# Altium integrated library Lattice CPLD ispLSI.IntLib: 471 symbols (part 16 of 26) (continued)
## ispLSI3320-100LB320 (continued)
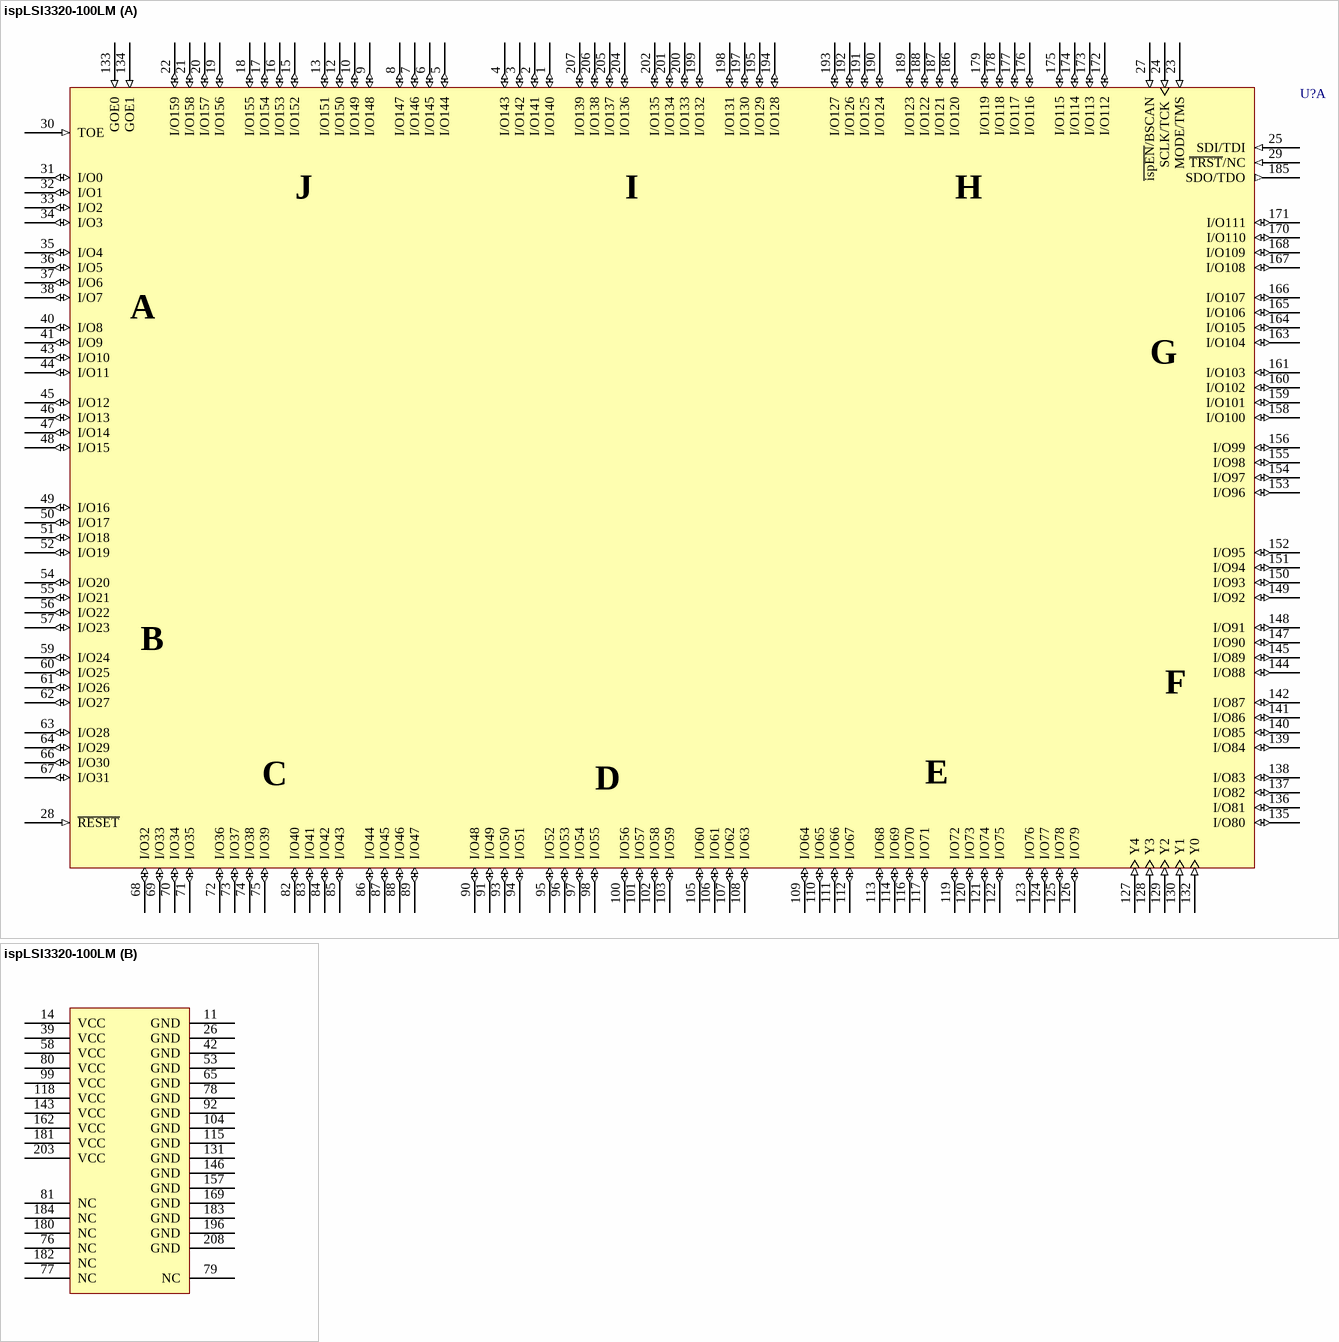
[diagram p153: symbol ispLSI3320-100LM]
part A text: J; I; H; A; G; B; F; C; E; D

## ispLSI3320-100LM
designator U?
In-System Programmable High-Density PLD; Published: 23-Sep-2002; LatestRevisionDate: 13-Apr-2006; LatestRevisionNote: IPC-7351 Footprint Added.; DatasheetVersion: May-1999; PackageVersion: Sep-2000; PackageReference: MQFP208; Publisher: Altium Limited; PackageDescription: 208-Pin Shrink Quad Flat Pack 0.5 mm Pitch; ComponentLink1Description: Manufacturer Link; ComponentLink1URL: http://www.latticesemi.com/products/mature/index.cfm; ComponentLink2Description: Datasheet; ComponentLink2URL: http://www.latticesemi.com/lit/docs/datasheets/cpld/3320.pdf
footprint MQFP208_N (Shrink QFP, 208-Leads, Body 27.7x27.7mm, Pitch 0.5mm, IPC Medium Density)
footprint MQFP208_L (Shrink QFP, 208-Leads, Body 27.7x27.7mm, Pitch 0.5mm, IPC High Density)
footprint MQFP208_M (Shrink QFP, 208-Leads, Body 27.7x27.7mm, Pitch 0.5mm, IPC Low Density)
3D model 3320-MQFP208 (208-Pin Shrink Quad Flat Pack 0.5 mm Pitch)
part A pins: 1 I/O140 (io), 2 I/O141 (io), 3 I/O142 (io), 4 I/O143 (io), 5 I/O144 (io), 6 I/O145 (io), 7 I/O146 (io), 8 I/O147 (io), 9 I/O148 (io), 10 I/O149 (io), 12 I/O150 (io), 13 I/O151 (io), 15 I/O152 (io), 16 I/O153 (io), 17 I/O154 (io), 18 I/O155 (io), 19 I/O156 (io), 20 I/O157 (io), 21 I/O158 (io), 22 I/O159 (io), 23 MODE/TMS (in), 24 SCLK/TCK (in), 25 SDI/TDI (in), 27 ~{ispEN}/BSCAN (in), 28 ~{RESET} (in), 29 ~{TRST}/NC (in), 30 TOE (in), 31 I/O0 (io), 32 I/O1 (io), 33 I/O2 (io), 34 I/O3 (io), 35 I/O4 (io), 36 I/O5 (io), 37 I/O6 (io), 38 I/O7 (io), 40 I/O8 (io), 41 I/O9 (io), 43 I/O10 (io), 44 I/O11 (io), 45 I/O12 (io), 46 I/O13 (io), 47 I/O14 (io), 48 I/O15 (io), 49 I/O16 (io), 50 I/O17 (io), 51 I/O18 (io), 52 I/O19 (io), 54 I/O20 (io), 55 I/O21 (io), 56 I/O22 (io), 57 I/O23 (io), 59 I/O24 (io), 60 I/O25 (io), 61 I/O26 (io), 62 I/O27 (io), 63 I/O28 (io), 64 I/O29 (io), 66 I/O30 (io), 67 I/O31 (io), 68 I/O32 (io), 69 I/O33 (io), 70 I/O34 (io), 71 I/O35 (io), 72 I/O36 (io), 73 I/O37 (io), 74 I/O38 (io), 75 I/O39 (io), 82 I/O40 (io), 83 I/O41 (io), 84 I/O42 (io), 85 I/O43 (io), 86 I/O44 (io), 87 I/O45 (io), 88 I/O46 (io), 89 I/O47 (io), 90 I/O48 (io), 91 I/O49 (io), 93 I/O50 (io), 94 I/O51 (io), 95 I/O52 (io), 96 I/O53 (io), 97 I/O54 (io), 98 I/O55 (io), 100 I/O56 (io), 101 I/O57 (io), 102 I/O58 (io), 103 I/O59 (io), 105 I/O60 (io), 106 I/O61 (io), 107 I/O62 (io), 108 I/O63 (io), 109 I/O64 (io), 110 I/O65 (io), 111 I/O66 (io), 112 I/O67 (io), 113 I/O68 (io), 114 I/O69 (io), 116 I/O70 (io), 117 I/O71 (io), 119 I/O72 (io), 120 I/O73 (io), 121 I/O74 (io), 122 I/O75 (io), 123 I/O76 (io), 124 I/O77 (io), 125 I/O78 (io), 126 I/O79 (io), 127 Y4 (in), 128 Y3 (in), 129 Y2 (in), 130 Y1 (in), 132 Y0 (in), 133 GOE0 (in), 134 GOE1 (in), 135 I/O80 (io), 136 I/O81 (io), 137 I/O82 (io), 138 I/O83 (io), 139 I/O84 (io), 140 I/O85 (io), 141 I/O86 (io), 142 I/O87 (io), 144 I/O88 (io), 145 I/O89 (io), 147 I/O90 (io), 148 I/O91 (io), 149 I/O92 (io), 150 I/O93 (io), 151 I/O94 (io), 152 I/O95 (io), 153 I/O96 (io), 154 I/O97 (io), 155 I/O98 (io), 156 I/O99 (io), 158 I/O100 (io), 159 I/O101 (io), 160 I/O102 (io), 161 I/O103 (io), 163 I/O104 (io), 164 I/O105 (io), 165 I/O106 (io), 166 I/O107 (io), 167 I/O108 (io), 168 I/O109 (io), 170 I/O110 (io), 171 I/O111 (io), 172 I/O112 (io), 173 I/O113 (io), 174 I/O114 (io), 175 I/O115 (io), 176 I/O116 (io), 177 I/O117 (io), 178 I/O118 (io), 179 I/O119 (io), 185 SDO/TDO (out), 186 I/O120 (io), 187 I/O121 (io), 188 I/O122 (io), 189 I/O123 (io), 190 I/O124 (io), 191 I/O125 (io), 192 I/O126 (io), 193 I/O127 (io), 194 I/O128 (io), 195 I/O129 (io), 197 I/O130 (io), 198 I/O131 (io), 199 I/O132 (io), 200 I/O133 (io), 201 I/O134 (io), 202 I/O135 (io), 204 I/O136 (io), 205 I/O137 (io), 206 I/O138 (io), 207 I/O139 (io)
part B pins: 11 GND (power), 14 VCC (power), 26 GND (power), 39 VCC (power), 42 GND (power), 53 GND (power), 58 VCC (power), 65 GND (power), 76 NC, 77 NC, 78 GND (power), 79 NC, 80 VCC (power), 81 NC, 92 GND (power), 99 VCC (power), 104 GND (power), 115 GND (power), 118 VCC (power), 131 GND (power), 143 VCC (power), 146 GND (power), 157 GND (power), 162 VCC (power), 169 GND (power), 180 NC, 181 VCC (power), 182 NC, 183 GND (power), 184 NC, 196 GND (power), 203 VCC (power), 208 GND (power)
part A text: J; I; H; A; G; B; F; C; E; D

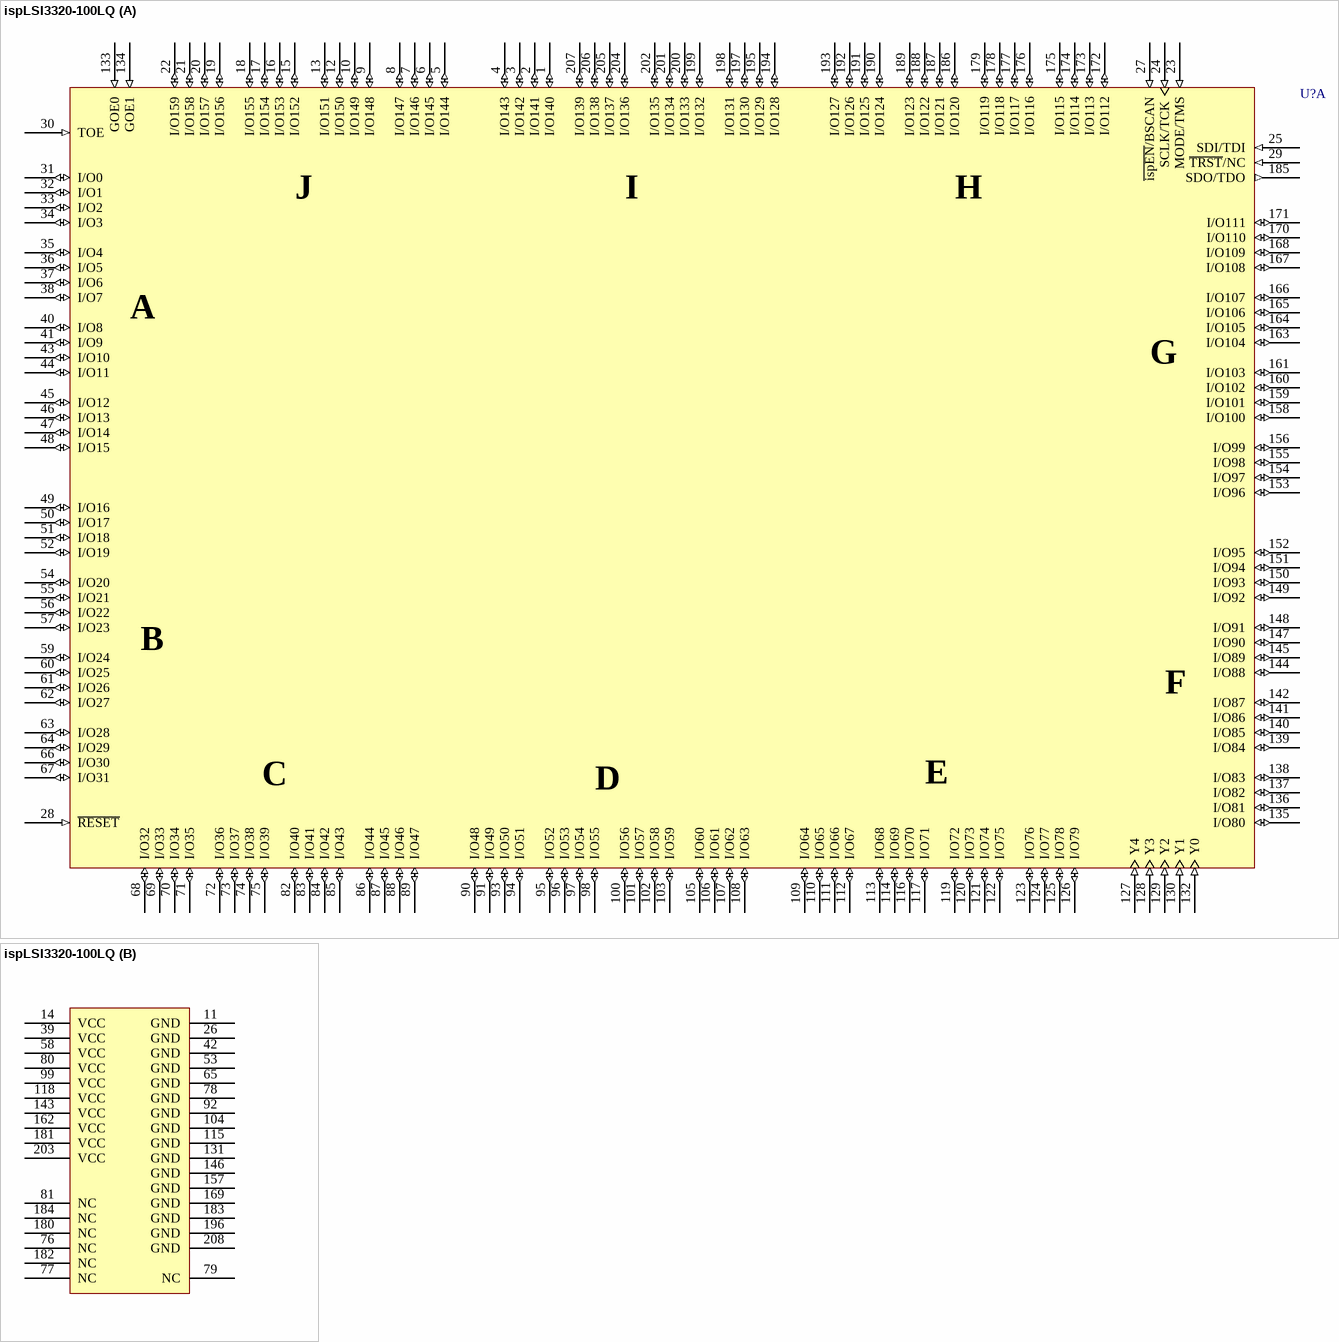
[diagram p154: symbol ispLSI3320-100LQ]

## ispLSI3320-100LQ
designator U?
In-System Programmable High-Density PLD; Published: 23-Sep-2002; LatestRevisionDate: 13-Apr-2006; LatestRevisionNote: IPC-7351 Footprint Added.; DatasheetVersion: May-1999; PackageVersion: pkg_32, Aug-2005; PackageReference: PQFP208; Publisher: Altium Limited; PackageDescription: 208-Pin Plastic Quad Flat Pack (PQFP208); Code_JEDEC: MO-143-FAI; ComponentLink1Description: Manufacturer Link; ComponentLink1URL: http://www.latticesemi.com/products/mature/index.cfm; ComponentLink2Description: Datasheet; ComponentLink2URL: http://www.latticesemi.com/lit/docs/datasheets/cpld/3320.pdf
footprint PQFP208_N (Shrink QFP, 208-Leads, Body 28x28mm, Pitch 0.5mm, IPC Medium Density)
footprint PQFP208_L (Shrink QFP, 208-Leads, Body 28x28mm, Pitch 0.5mm, IPC High Density)
footprint PQFP208_M (Shrink QFP, 208-Leads, Body 28x28mm, Pitch 0.5mm, IPC Low Density)
3D model 3320-PQFP208 (208-Pin Plastic Quad Flat Pack (PQFP208))
part A pins: 1 I/O140 (io), 2 I/O141 (io), 3 I/O142 (io), 4 I/O143 (io), 5 I/O144 (io), 6 I/O145 (io), 7 I/O146 (io), 8 I/O147 (io), 9 I/O148 (io), 10 I/O149 (io), 12 I/O150 (io), 13 I/O151 (io), 15 I/O152 (io), 16 I/O153 (io), 17 I/O154 (io), 18 I/O155 (io), 19 I/O156 (io), 20 I/O157 (io), 21 I/O158 (io), 22 I/O159 (io), 23 MODE/TMS (in), 24 SCLK/TCK (in), 25 SDI/TDI (in), 27 ~{ispEN}/BSCAN (in), 28 ~{RESET} (in), 29 ~{TRST}/NC (in), 30 TOE (in), 31 I/O0 (io), 32 I/O1 (io), 33 I/O2 (io), 34 I/O3 (io), 35 I/O4 (io), 36 I/O5 (io), 37 I/O6 (io), 38 I/O7 (io), 40 I/O8 (io), 41 I/O9 (io), 43 I/O10 (io), 44 I/O11 (io), 45 I/O12 (io), 46 I/O13 (io), 47 I/O14 (io), 48 I/O15 (io), 49 I/O16 (io), 50 I/O17 (io), 51 I/O18 (io), 52 I/O19 (io), 54 I/O20 (io), 55 I/O21 (io), 56 I/O22 (io), 57 I/O23 (io), 59 I/O24 (io), 60 I/O25 (io), 61 I/O26 (io), 62 I/O27 (io), 63 I/O28 (io), 64 I/O29 (io), 66 I/O30 (io), 67 I/O31 (io), 68 I/O32 (io), 69 I/O33 (io), 70 I/O34 (io), 71 I/O35 (io), 72 I/O36 (io), 73 I/O37 (io), 74 I/O38 (io), 75 I/O39 (io), 82 I/O40 (io), 83 I/O41 (io), 84 I/O42 (io), 85 I/O43 (io), 86 I/O44 (io), 87 I/O45 (io), 88 I/O46 (io), 89 I/O47 (io), 90 I/O48 (io), 91 I/O49 (io), 93 I/O50 (io), 94 I/O51 (io), 95 I/O52 (io), 96 I/O53 (io), 97 I/O54 (io), 98 I/O55 (io), 100 I/O56 (io), 101 I/O57 (io), 102 I/O58 (io), 103 I/O59 (io), 105 I/O60 (io), 106 I/O61 (io), 107 I/O62 (io), 108 I/O63 (io), 109 I/O64 (io), 110 I/O65 (io), 111 I/O66 (io), 112 I/O67 (io), 113 I/O68 (io), 114 I/O69 (io), 116 I/O70 (io), 117 I/O71 (io), 119 I/O72 (io), 120 I/O73 (io), 121 I/O74 (io), 122 I/O75 (io), 123 I/O76 (io), 124 I/O77 (io), 125 I/O78 (io), 126 I/O79 (io), 127 Y4 (in), 128 Y3 (in), 129 Y2 (in), 130 Y1 (in), 132 Y0 (in), 133 GOE0 (in), 134 GOE1 (in), 135 I/O80 (io), 136 I/O81 (io), 137 I/O82 (io), 138 I/O83 (io), 139 I/O84 (io), 140 I/O85 (io), 141 I/O86 (io), 142 I/O87 (io), 144 I/O88 (io), 145 I/O89 (io), 147 I/O90 (io), 148 I/O91 (io), 149 I/O92 (io), 150 I/O93 (io), 151 I/O94 (io), 152 I/O95 (io), 153 I/O96 (io), 154 I/O97 (io), 155 I/O98 (io), 156 I/O99 (io), 158 I/O100 (io), 159 I/O101 (io), 160 I/O102 (io), 161 I/O103 (io), 163 I/O104 (io), 164 I/O105 (io), 165 I/O106 (io), 166 I/O107 (io), 167 I/O108 (io), 168 I/O109 (io), 170 I/O110 (io), 171 I/O111 (io), 172 I/O112 (io), 173 I/O113 (io), 174 I/O114 (io), 175 I/O115 (io), 176 I/O116 (io), 177 I/O117 (io), 178 I/O118 (io), 179 I/O119 (io), 185 SDO/TDO (out), 186 I/O120 (io), 187 I/O121 (io), 188 I/O122 (io), 189 I/O123 (io), 190 I/O124 (io), 191 I/O125 (io), 192 I/O126 (io), 193 I/O127 (io), 194 I/O128 (io), 195 I/O129 (io), 197 I/O130 (io), 198 I/O131 (io), 199 I/O132 (io), 200 I/O133 (io), 201 I/O134 (io), 202 I/O135 (io), 204 I/O136 (io), 205 I/O137 (io), 206 I/O138 (io), 207 I/O139 (io)
part B pins: 11 GND (power), 14 VCC (power), 26 GND (power), 39 VCC (power), 42 GND (power), 53 GND (power), 58 VCC (power), 65 GND (power), 76 NC, 77 NC, 78 GND (power), 79 NC, 80 VCC (power), 81 NC, 92 GND (power), 99 VCC (power), 104 GND (power), 115 GND (power), 118 VCC (power), 131 GND (power), 143 VCC (power), 146 GND (power), 157 GND (power), 162 VCC (power), 169 GND (power), 180 NC, 181 VCC (power), 182 NC, 183 GND (power), 184 NC, 196 GND (power), 203 VCC (power), 208 GND (power)
part A text: J; I; H; A; G; B; F; C; E; D

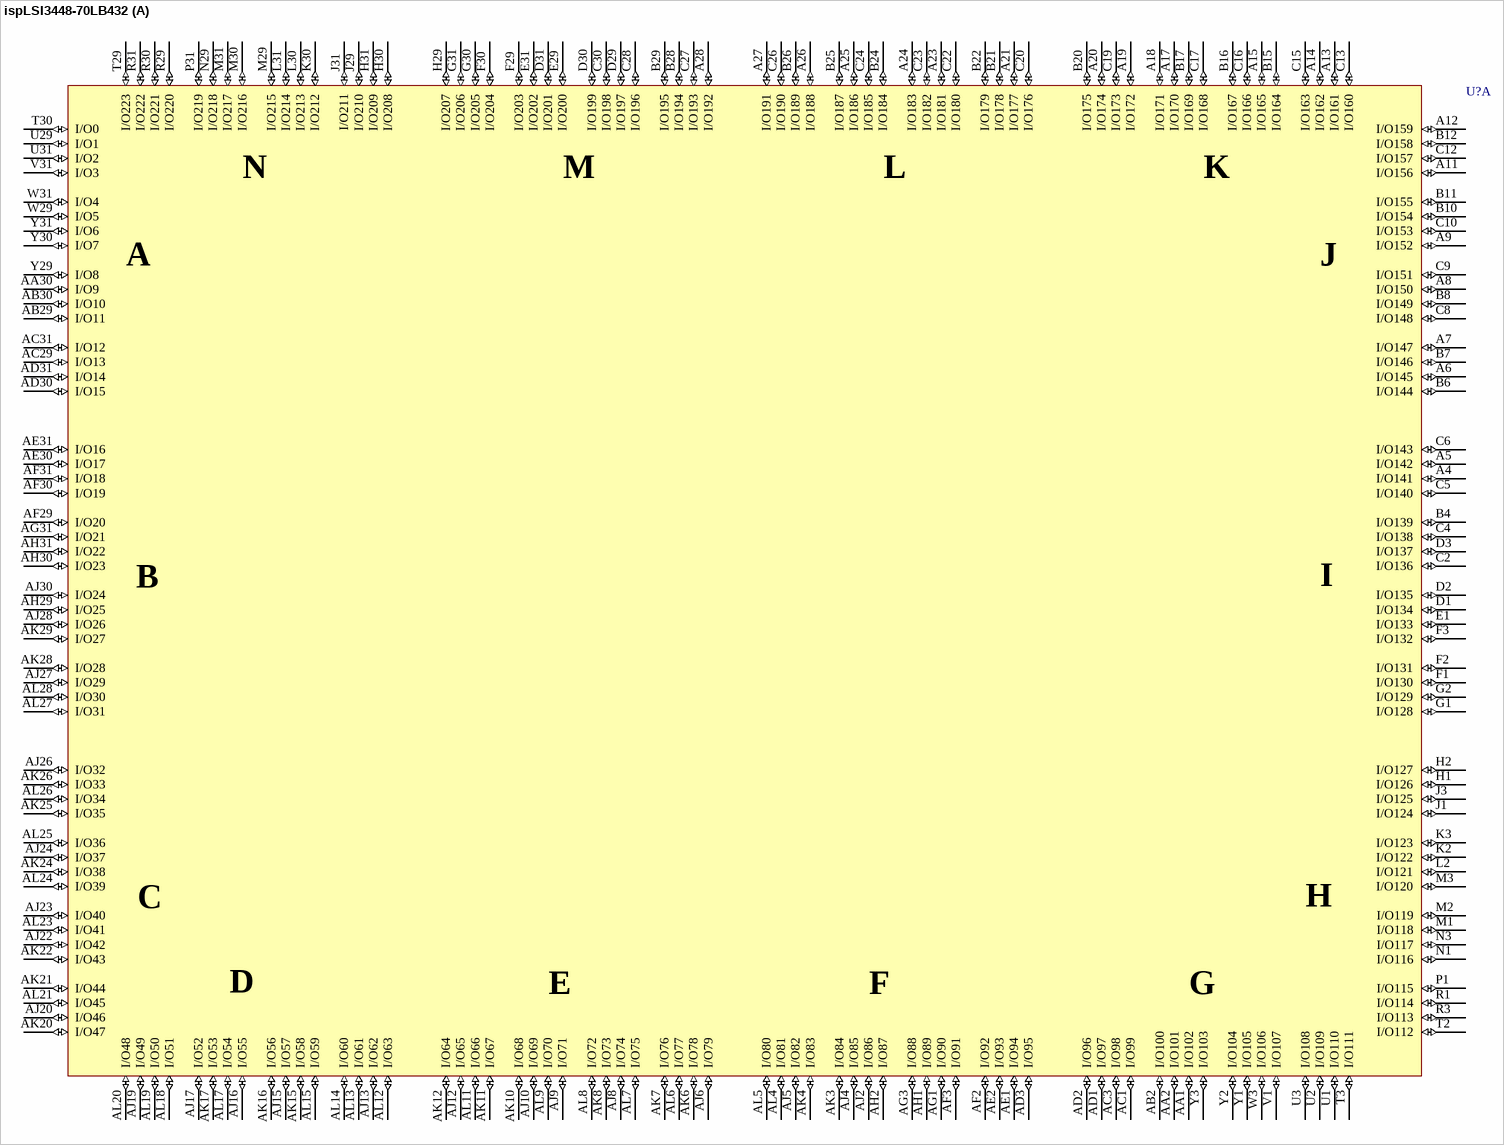
[diagram p155: symbol ispLSI3448-70LB432]

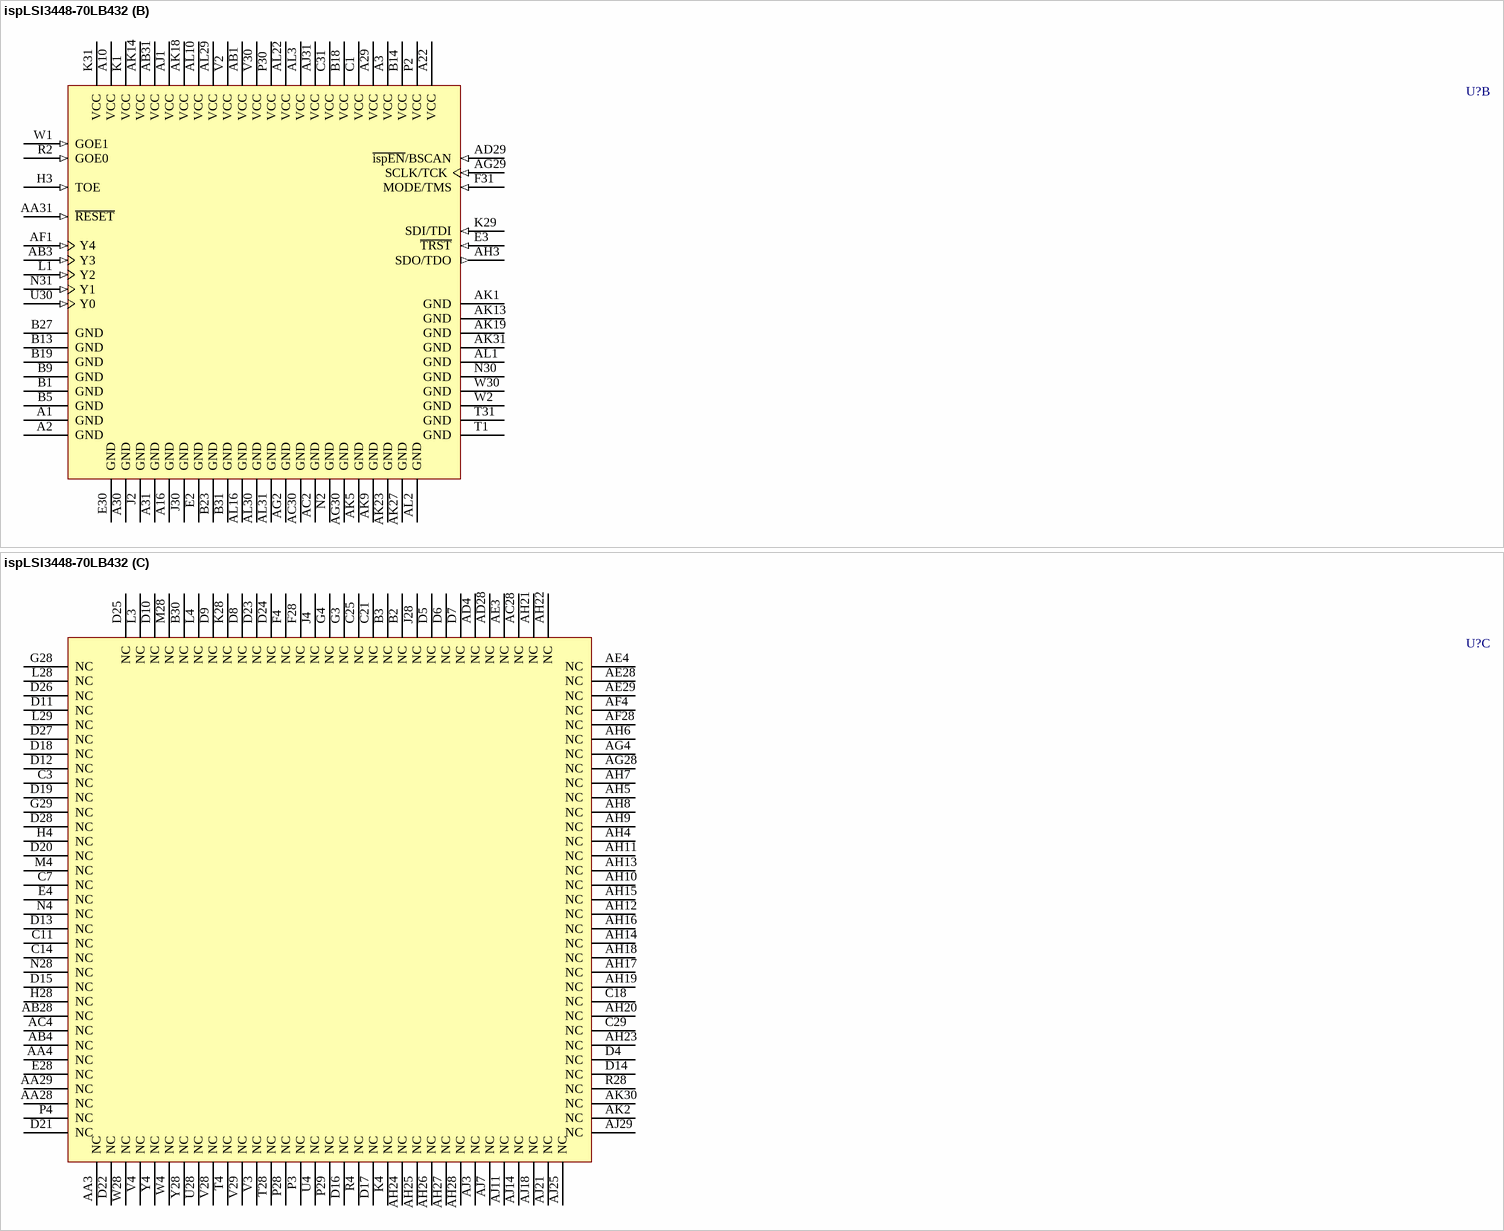
[diagram p156: symbol ispLSI3448-70LB432]

## ispLSI3448-70LB432
designator U?
In-System Programmable High-Density PLD; Published: 23-Sep-2002; LatestRevisionDate: 13-Apr-2006; LatestRevisionNote: IPC-7351 Footprint Added.; DatasheetVersion: Feb-2000; PackageVersion: pkg_32, Aug-2005; PackageReference: SBGA432; Publisher: Altium Limited; PackageDescription: 432-Ball Super Ball Grid Array (SBGA432); ComponentLink1Description: Manufacturer Link; ComponentLink1URL: http://www.latticesemi.com/products/mature/index.cfm; ComponentLink2Description: Datasheet; ComponentLink2URL: http://www.latticesemi.com/lit/docs/datasheets/cpld/3448.pdf
footprint SBGA432 (BGA, 432-Leads, Body 40x40mm, Pitch 1.27mm)
3D model 3448-SBGA432 (432-Ball Super Ball Grid Array (SBGA432))
part A pins: A4 I/O141 (io), A5 I/O142 (io), A6 I/O145 (io), A7 I/O147 (io), A8 I/O150 (io), A9 I/O152 (io), A11 I/O156 (io), A12 I/O159 (io), A13 I/O161 (io), A14 I/O162 (io), A15 I/O165 (io), A17 I/O170 (io), A18 I/O171 (io), A19 I/O172 (io), A20 I/O174 (io), A21 I/O177 (io), A23 I/O181 (io), A24 I/O183 (io), A25 I/O186 (io), A26 I/O188 (io), A27 I/O191 (io), A28 I/O192 (io), AA1 I/O102 (io), AA2 I/O101 (io), AA30 I/O9 (io), AB2 I/O100 (io), AB29 I/O11 (io), AB30 I/O10 (io), AC1 I/O99 (io), AC3 I/O98 (io), AC29 I/O13 (io), AC31 I/O12 (io), AD1 I/O97 (io), AD2 I/O96 (io), AD3 I/O95 (io), AD30 I/O15 (io), AD31 I/O14 (io), AE1 I/O94 (io), AE2 I/O93 (io), AE30 I/O17 (io), AE31 I/O16 (io), AF2 I/O92 (io), AF3 I/O91 (io), AF29 I/O20 (io), AF30 I/O19 (io), AF31 I/O18 (io), AG1 I/O90 (io), AG3 I/O88 (io), AG31 I/O21 (io), AH1 I/O89 (io), AH2 I/O87 (io), AH29 I/O25 (io), AH30 I/O23 (io), AH31 I/O22 (io), AJ2 I/O86 (io), AJ4 I/O85 (io), AJ5 I/O82 (io), AJ6 I/O79 (io), AJ8 I/O74 (io), AJ9 I/O71 (io), AJ10 I/O69 (io), AJ12 I/O65 (io), AJ13 I/O62 (io), AJ15 I/O57 (io), AJ16 I/O55 (io), AJ17 I/O52 (io), AJ19 I/O49 (io), AJ20 I/O46 (io), AJ22 I/O42 (io), AJ23 I/O40 (io), AJ24 I/O37 (io), AJ26 I/O32 (io), AJ27 I/O29 (io), AJ28 I/O26 (io), AJ30 I/O24 (io), AK3 I/O84 (io), AK4 I/O83 (io), AK6 I/O78 (io), AK7 I/O76 (io), AK8 I/O73 (io), AK10 I/O68 (io), AK11 I/O67 (io), AK12 I/O64 (io), AK15 I/O58 (io), AK16 I/O56 (io), AK17 I/O53 (io), AK20 I/O47 (io), AK21 I/O44 (io), AK22 I/O43 (io), AK24 I/O38 (io), AK25 I/O35 (io), AK26 I/O33 (io), AK28 I/O28 (io), AK29 I/O27 (io), AL4 I/O81 (io), AL5 I/O80 (io), AL6 I/O77 (io), AL7 I/O75 (io), AL8 I/O72 (io), AL9 I/O70 (io), AL11 I/O66 (io), AL12 I/O63 (io), AL13 I/O61 (io), AL14 I/O60 (io), AL15 I/O59 (io), AL17 I/O54 (io), AL18 I/O51 (io), AL19 I/O50 (io), AL20 I/O48 (io), AL21 I/O45 (io), AL23 I/O41 (io), AL24 I/O39 (io), AL25 I/O36 (io), AL26 I/O34 (io), AL27 I/O31 (io), AL28 I/O30 (io), B4 I/O139 (io), B6 I/O144 (io), B7 I/O146 (io), B8 I/O149 (io), B10 I/O154 (io), B11 I/O155 (io), B12 I/O158 (io), B15 I/O164 (io), B16 I/O167 (io), B17 I/O169 (io), B20 I/O175 (io), B21 I/O178 (io), B22 I/O179 (io), B24 I/O184 (io), B25 I/O187 (io), B26 I/O189 (io), B28 I/O194 (io), B29 I/O195 (io), C2 I/O136 (io), C4 I/O138 (io), C5 I/O140 (io), C6 I/O143 (io), C8 I/O148 (io), C9 I/O151 (io), C10 I/O153 (io), C12 I/O157 (io), C13 I/O160 (io), C15 I/O163 (io), C16 I/O166 (io), C17 I/O168 (io), C19 I/O173 (io), C20 I/O176 (io), C22 I/O180 (io), C23 I/O182 (io), C24 I/O185 (io), C26 I/O190 (io), C27 I/O193 (io), C28 I/O196 (io), C30 I/O198 (io), D1 I/O134 (io), D2 I/O135 (io), D3 I/O137 (io), D29 I/O197 (io), D30 I/O199 (io), D31 I/O201 (io), E1 I/O133 (io), E29 I/O200 (io), E31 I/O202 (io), F1 I/O130 (io), F2 I/O131 (io), F3 I/O132 (io), F29 I/O203 (io), F30 I/O204 (io), G1 I/O128 (io), G2 I/O129 (io), G30 I/O205 (io), G31 I/O206 (io), H1 I/O126 (io), H2 I/O127 (io), H29 I/O207 (io), H30 I/O208 (io), H31 I/O209 (io), J1 I/O124 (io), J3 I/O125 (io), J29 I/O210 (io), J31 I/O211 (io), K2 I/O122 (io), K3 I/O123 (io), K30 I/O212 (io), L2 I/O121 (io), L30 I/O213 (io), L31 I/O214 (io), M1 I/O118 (io), M2 I/O119 (io), M3 I/O120 (io), M29 I/O215 (io), M30 I/O216 (io), M31 I/O217 (io), N1 I/O116 (io), N3 I/O117 (io), N29 I/O218 (io), P1 I/O115 (io), P31 I/O219 (io), R1 I/O114 (io), R3 I/O113 (io), R29 I/O220 (io), R30 I/O221 (io), R31 I/O222 (io), T2 I/O112 (io), T3 I/O111 (io), T29 I/O223 (io), T30 I/O0 (io), U1 I/O110 (io), U2 I/O109 (io), U3 I/O108 (io), U29 I/O1 (io), U31 I/O2 (io), V1 I/O107 (io), V31 I/O3 (io), W3 I/O106 (io), W29 I/O5 (io), W31 I/O4 (io), Y1 I/O105 (io), Y2 I/O104 (io), Y3 I/O103 (io), Y29 I/O8 (io), Y30 I/O7 (io), Y31 I/O6 (io)
part B pins: A1 GND (power), A2 GND (power), A3 VCC (power), A10 VCC (power), A16 GND (power), A22 VCC (power), A29 VCC (power), A30 GND (power), A31 GND (power), AA31 ~{RESET} (in), AB1 VCC (power), AB3 Y3 (in), AB31 VCC (power), AC2 GND (power), AC30 GND (power), AD29 ~{ispEN}/BSCAN (in), AF1 Y4 (in), AG2 GND (power), AG29 SCLK/TCK (in), AG30 GND (power), AH3 SDO/TDO (out), AJ1 VCC (power), AJ31 VCC (power), AK1 GND (power), AK5 GND (power), AK9 GND (power), AK13 GND (power), AK14 VCC (power), AK18 VCC (power), AK19 GND (power), AK23 GND (power), AK27 GND (power), AK31 GND (power), AL1 GND (power), AL2 GND (power), AL3 VCC (power), AL10 VCC (power), AL16 GND (power), AL22 VCC (power), AL29 VCC (power), AL30 GND (power), AL31 GND (power), B1 GND (power), B5 GND (power), B9 GND (power), B13 GND (power), B14 VCC (power), B18 VCC (power), B19 GND (power), B23 GND (power), B27 GND (power), B31 GND (power), C1 VCC (power), C31 VCC (power), E2 GND (power), E3 ~{TRST} (in), E30 GND (power), F31 MODE/TMS (in), H3 TOE (in), J2 GND (power), J30 GND (power), K1 VCC (power), K29 SDI/TDI (in), K31 VCC (power), L1 Y2 (in), N2 GND (power), N30 GND (power), N31 Y1 (in), P2 VCC (power), P30 VCC (power), R2 GOE0 (in), T1 GND (power), T31 GND (power), U30 Y0 (in), V2 VCC (power), V30 VCC (power), W1 GOE1 (in), W2 GND (power), W30 GND (power)
part C pins: AA3 NC, AA4 NC, AA28 NC, AA29 NC, AB4 NC, AB28 NC, AC4 NC, AC28 NC, AD4 NC, AD28 NC, AE3 NC, AE4 NC, AE28 NC, AE29 NC, AF4 NC, AF28 NC, AG4 NC, AG28 NC, AH4 NC, AH5 NC, AH6 NC, AH7 NC, AH8 NC, AH9 NC, AH10 NC, AH11 NC, AH12 NC, AH13 NC, AH14 NC, AH15 NC, AH16 NC, AH17 NC, AH18 NC, AH19 NC, AH20 NC, AH21 NC, AH22 NC, AH23 NC, AH24 NC, AH25 NC, AH26 NC, AH27 NC, AH28 NC, AJ3 NC, AJ7 NC, AJ11 NC, AJ14 NC, AJ18 NC, AJ21 NC, AJ25 NC, AJ29 NC, AK2 NC, AK30 NC, B2 NC, B3 NC, B30 NC, C3 NC, C7 NC, C11 NC, C14 NC, C18 NC, C21 NC, C25 NC, C29 NC, D4 NC, D5 NC, D6 NC, D7 NC, D8 NC, D9 NC, D10 NC, D11 NC, D12 NC, D13 NC, D14 NC, D15 NC, D16 NC, D17 NC, D18 NC, D19 NC, D20 NC, D21 NC, D22 NC, D23 NC, D24 NC, D25 NC, D26 NC, D27 NC, D28 NC, E4 NC, E28 NC, F4 NC, F28 NC, G3 NC, G4 NC, G28 NC, G29 NC, H4 NC, H28 NC, J4 NC, J28 NC, K4 NC, K28 NC, L3 NC, L4 NC, L28 NC, L29 NC, M4 NC, M28 NC, N4 NC, N28 NC, P3 NC, P4 NC, P28 NC, P29 NC, R4 NC, R28 NC, T4 NC, T28 NC, U4 NC, U28 NC, V3 NC, V4 NC, V28 NC, V29 NC, W4 NC, W28 NC, Y4 NC, Y28 NC
part A text: N; M; L; K; A; J; B; I; C; H; D; E; F; G

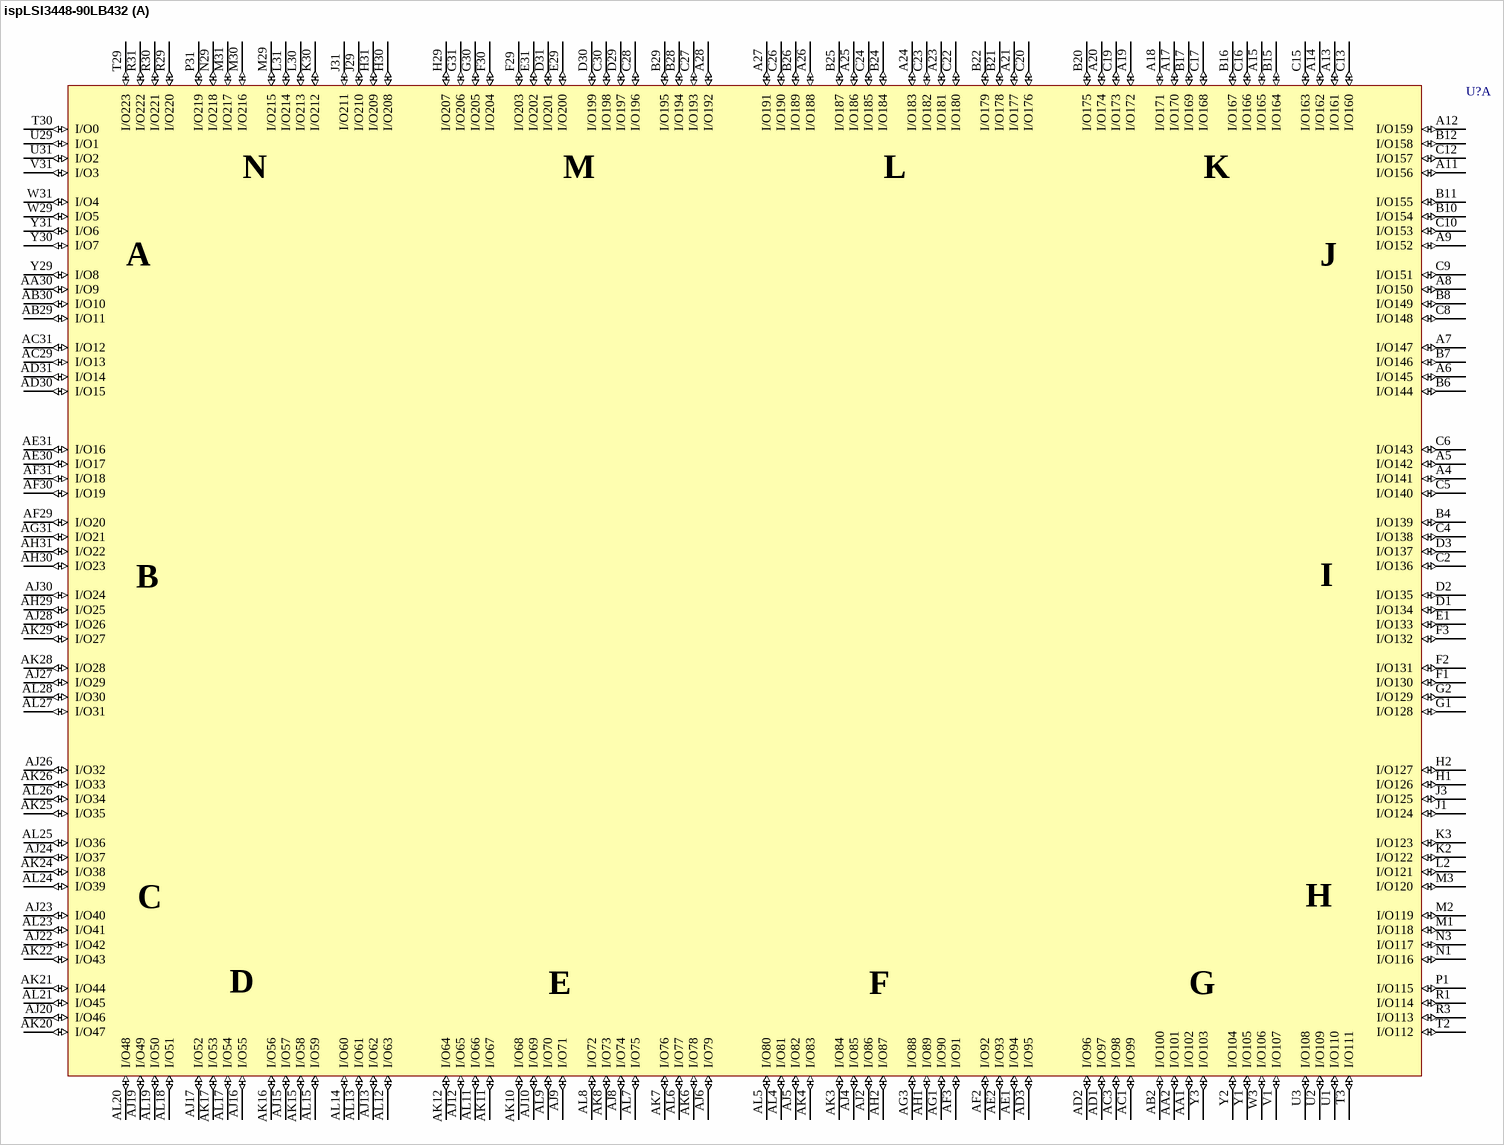
[diagram p157: symbol ispLSI3448-90LB432]

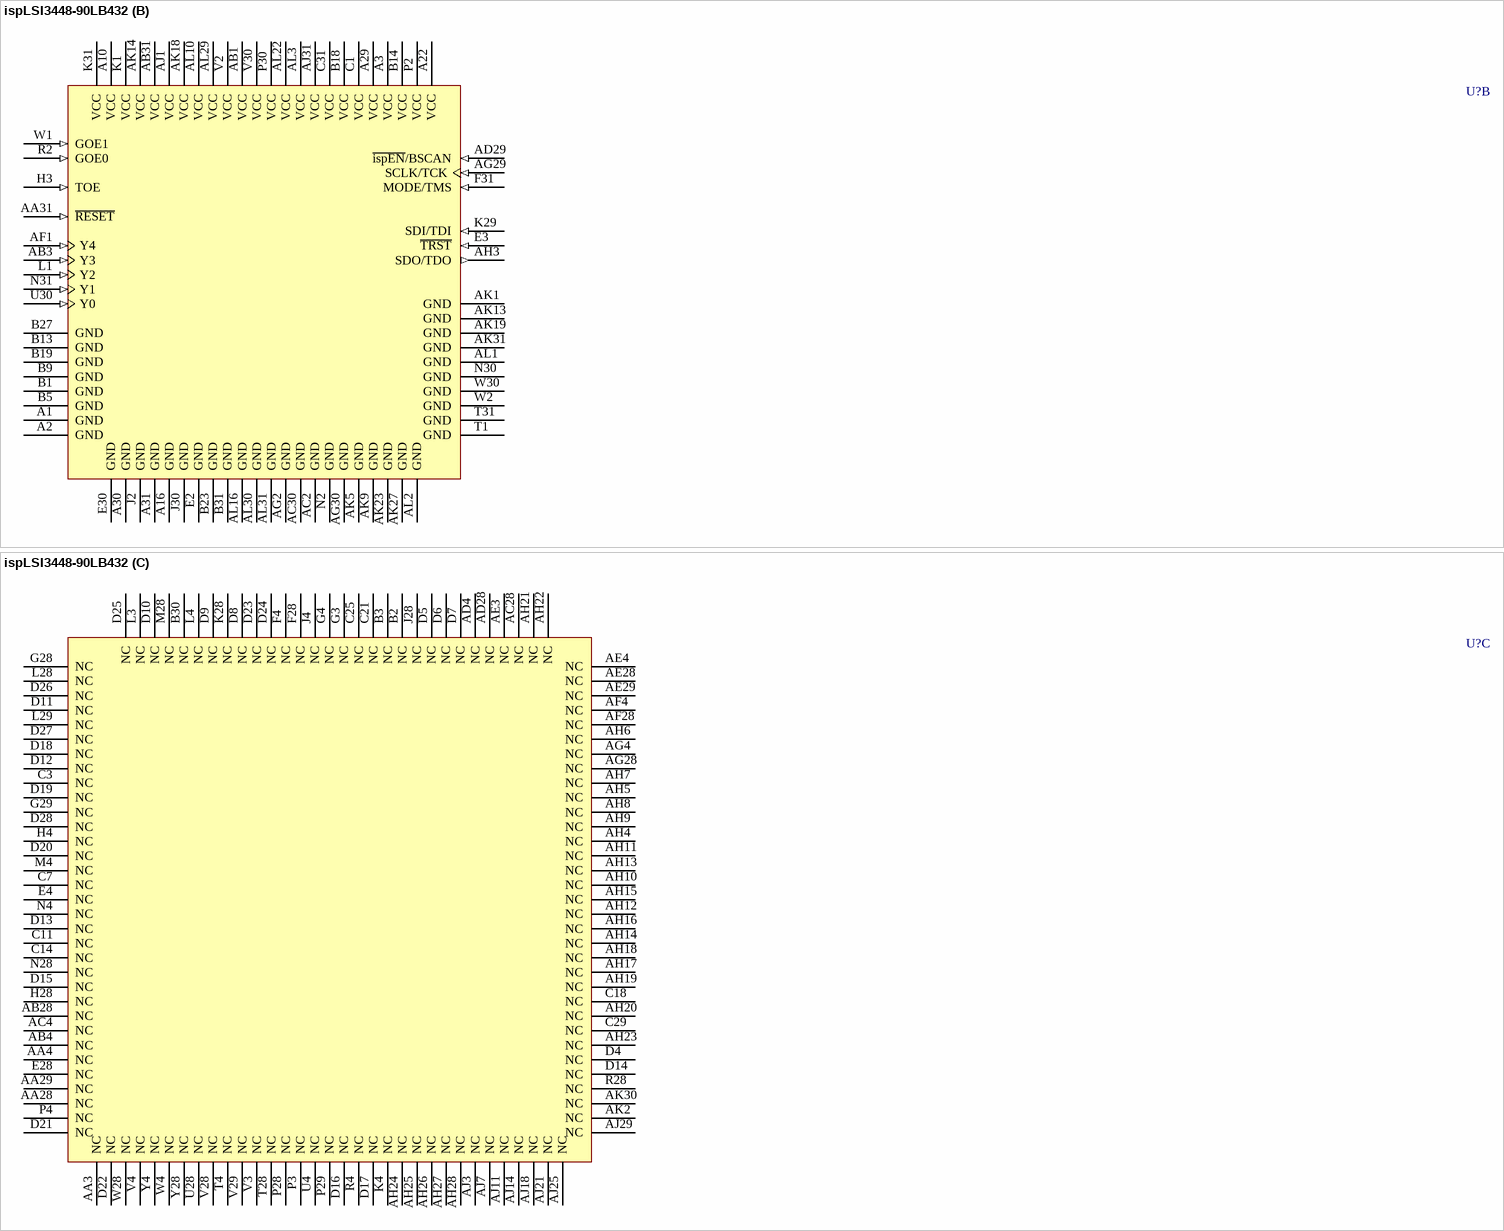
[diagram p158: symbol ispLSI3448-90LB432]